# Altium footprint library Hydra_Ref_pcb.PcbLib: 353 footprints (part 2 of 23)
Each footprint in its own frame and in the unit in brackets; x right, y up, seen from the top. Pads: shape width x height; smd on the part's side, far side on the other; paste and mask are expansions set on the pad; w line width, h text height; cw(c..) or ccw(c..) is an arc to the next point about the centre after c.
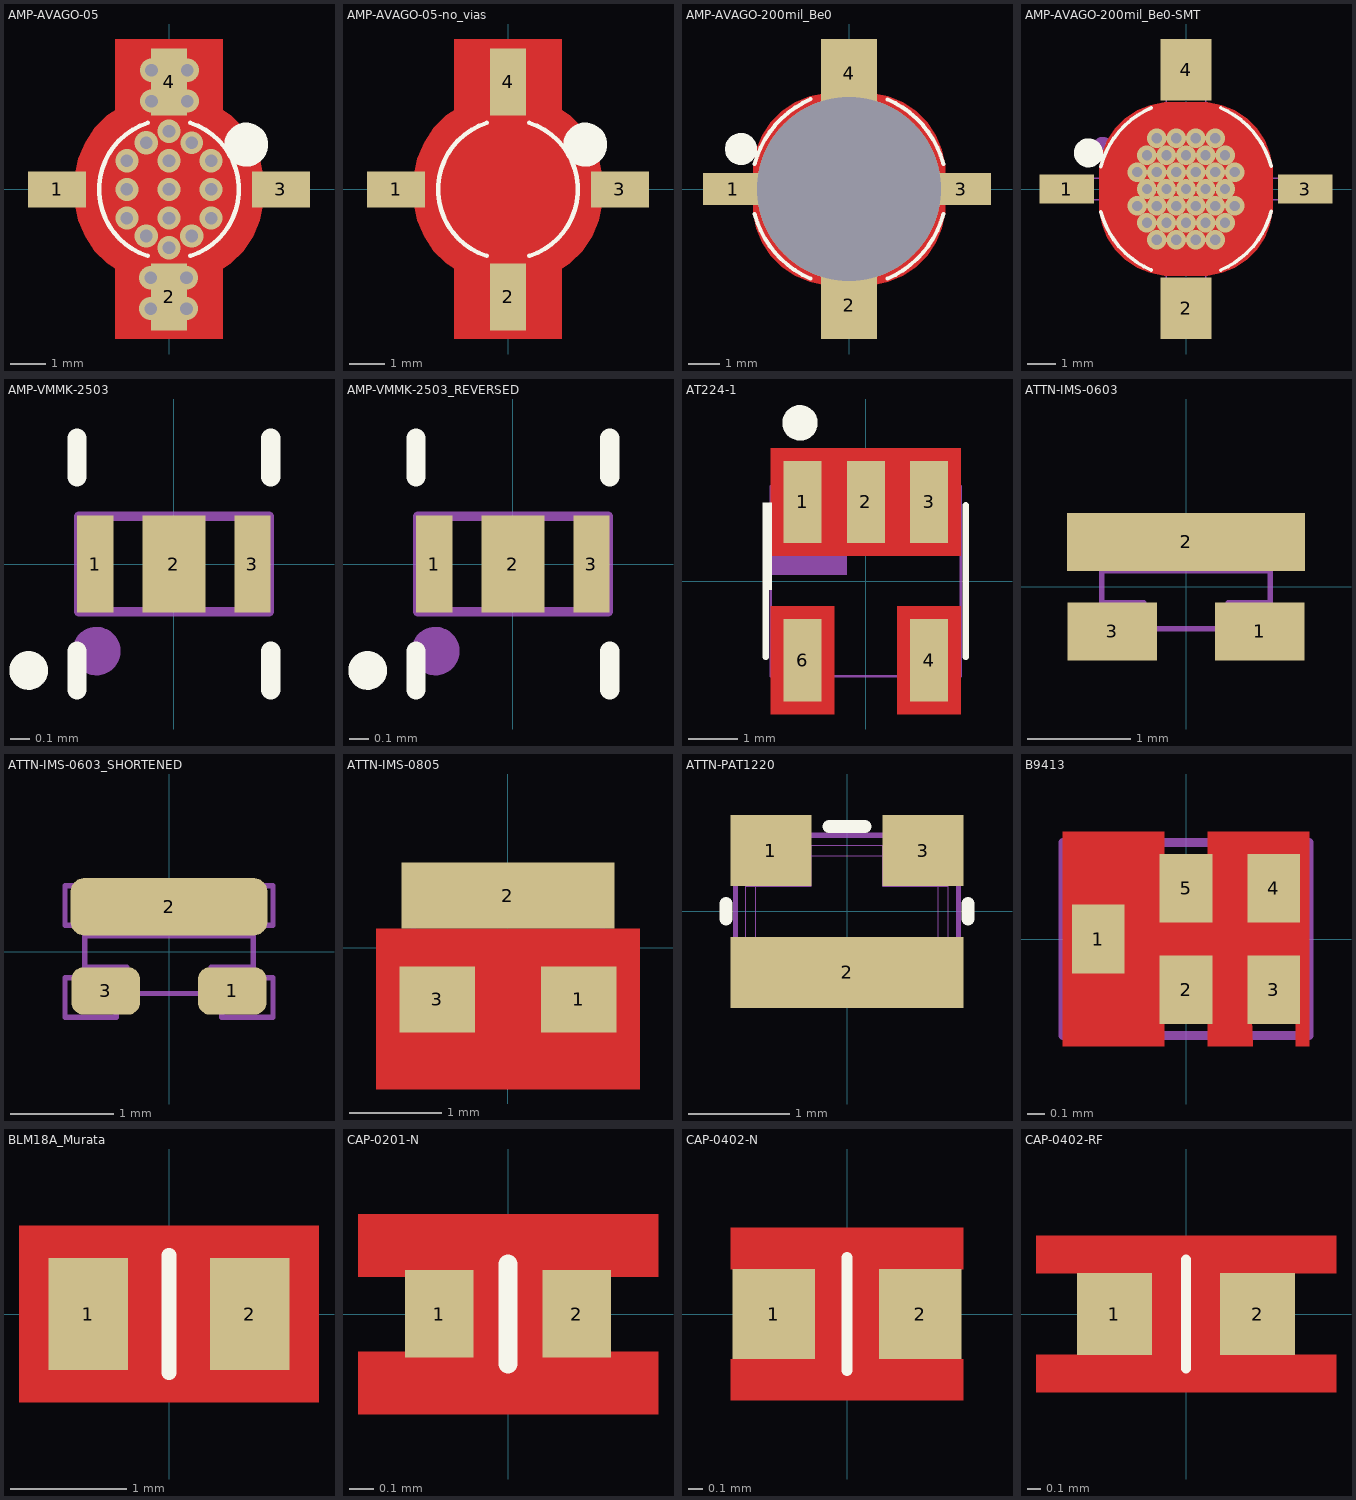
[diagram p1: the footprints below, top view; thin cyan lines are the x and y axes]

## AMP-AVAGO-05 [mil] "05 Plastic Package - Avago"
height 145
pads (4):
  rect 65x40 smd: 1(-125,0) 3(125,0)
  rect 40x75 smd: 2(0,-120) 4(0,120)
via 0,-65 diameter 26 hole 14
via 0,65 diameter 26 hole 14
via -19.56,133 diameter 26 hole 14
via 20.44,133 diameter 26 hole 14
via -20.44,-133 diameter 26 hole 14
via 19.56,-133 diameter 26 hole 14
via 20.44,98.68 diameter 26 hole 14
via -19.56,98.68 diameter 26 hole 14
via 19.56,-98.68 diameter 26 hole 14
via -20.44,-98.68 diameter 26 hole 14
via 0,0 diameter 26 hole 14
via -47,0 diameter 26 hole 14
via -47,32 diameter 26 hole 14
via -47,-32 diameter 26 hole 14
via 47,32 diameter 26 hole 14
via 47,-32 diameter 26 hole 14
via 47,0 diameter 26 hole 14
via 0,-32 diameter 26 hole 14
via 0,32 diameter 26 hole 14
via -25.5,52 diameter 26 hole 14
via 25.5,52 diameter 25 hole 14
via -25.5,-52 diameter 26 hole 14
via 25.5,-52 diameter 26 hole 14
Top Layer:
  rectangle: -20,-157 20,157
  pour cut-out: 5.31,105 15.16,105 34.48,101.16 52.68,93.62 69.06,82.67 82.99,68.75 93.93,52.37 101.47,34.17 105.31,14.85 105.31,5 105.31,-5 105.31,-14.85 101.47,-34.17 93.93,-52.37 82.99,-68.75 69.06,-82.67 52.68,-93.62 34.48,-101.16 15.16,-105 5.31,-105 -5,-105 -14.85,-105 -34.17,-101.16 -52.37,-93.62 -68.75,-82.67 -82.67,-68.75 -93.62,-52.37 -101.16,-34.17 -105,-14.85 -105,-5 -105,5 -105,14.85 -101.16,34.17 -93.62,52.37 -82.67,68.75 -68.75,82.67 -52.37,93.62 -34.17,101.16 -14.85,105 -5,105
  pour cut-out: 60,168 60,-167 -60,-167 -60,168
  region: 0,73 12,72 23,69 37,63 49,54 60,42 60,-42 52,-52 40,-61 26,-68 10,-72 -8,-72 -23.76,-69 -38,-62 -52,-52 -60,-41 -60,42 -51,52 -41,61 -27,68 -15,71 -1,73
Top Overlay:
  circle w25: c86.3,50.09 r12
  lines w5: -23.76,-74.29 cw(c0,0) -23.77,74.29 ; 23.77,-74.29 ccw(c0,0) 23.86,74.26
9 Top Assy:
  circle w2: c0,0 r73
  circle w2: c45,0 r15
  lines w2: -102.5,-15 -102.5,15 ; -71,-15 -135,-15 -125,15 -71,15 ; -15,-102.5 15,-102.5 ; -15,-71 -15,-135 15,-135 15,-71 ; -15,71 -15,135 15,135 15,71 ; -15,102.5 15,102.5 ; 71,-15 135,-15 135,15 71,15 ; 102.5,-15 102.5,15
  text ".Designator" at 15,-60 h35
3D body: height 120, standoff 0, extent -85,-85 85,85

## AMP-AVAGO-05-no_vias [mil] "05 Plastic Package - Avago"
height 145
pads (4):
  rect 65x40 smd: 1(-125,0) 3(125,0)
  rect 40x75 smd: 2(0,-120) 4(0,120)
Top Layer:
  region: 20,70 23,69 37,63 49,54 60,42 60,-42 52,-52 40,-61 26,-68 21,-70 -22,-70 -38,-62 -52,-52 -60,-41 -60,42 -51,52 -41,61 -27,68 -19,70
  pour cut-out: 60,168 60,-167 -60,-167 -60,168
  pour cut-out: 5.31,105 15.16,105 34.48,101.16 52.68,93.62 69.06,82.67 82.99,68.75 93.93,52.37 101.47,34.17 105.31,14.85 105.31,5 105.31,-5 105.31,-14.85 101.47,-34.17 93.93,-52.37 82.99,-68.75 69.06,-82.67 52.68,-93.62 34.48,-101.16 15.16,-105 5.31,-105 -5,-105 -14.85,-105 -34.17,-101.16 -52.37,-93.62 -68.75,-82.67 -82.67,-68.75 -93.62,-52.37 -101.16,-34.17 -105,-14.85 -105,-5 -105,5 -105,14.85 -101.16,34.17 -93.62,52.37 -82.67,68.75 -68.75,82.67 -52.37,93.62 -34.17,101.16 -14.85,105 -5,105
Top Overlay:
  circle w25: c86.3,50.09 r12
  lines w5: -23.76,-74.29 cw(c0,0) -23.77,74.29 ; 23.77,-74.29 ccw(c0,0) 23.86,74.26
9 Top Assy:
  circle w2: c45,0 r15
  circle w2: c0,0 r73
  lines w2: -102.5,-15 -102.5,15 ; -71,-15 -135,-15 -125,15 -71,15 ; -15,-102.5 15,-102.5 ; -15,-71 -15,-135 15,-135 15,-71 ; -15,71 -15,135 15,135 15,71 ; -15,102.5 15,102.5 ; 71,-15 135,-15 135,15 71,15 ; 102.5,-15 102.5,15
  text ".Designator" at 15,-60 h35
3D body: height 120, standoff 0, extent -85,-85 85,85

## AMP-AVAGO-200mil_Be0 [mil] "200mil Be0 Package Dimensions - Avago"
height 58
pads (4):
  rect 75x40 smd: 1(-145,0) 3(140,0)
  rect 70x85 smd: 2(0,-145) 4(0,145)
via 94.5,-23.38 diameter 27 hole 14
via 27,-93.53 diameter 27 hole 14
via 0,-93.53 diameter 27 hole 14
via -27,-93.53 diameter 27 hole 14
via -94.5,-23.38 diameter 27 hole 14
via -94.5,23.38 diameter 27 hole 14
via -27,93.53 diameter 27 hole 14
via 27,93.53 diameter 27 hole 14
via 0,93.53 diameter 27 hole 14
via 40.5,70.15 diameter 27 hole 14
via 54,46.77 diameter 27 hole 14
via 67.5,23.38 diameter 27 hole 14
via 81,0 diameter 27 hole 14
via 13.5,70.15 diameter 27 hole 14
via 40.5,-70.15 diameter 27 hole 14
via 54,-46.77 diameter 27 hole 14
via 67.5,-23.38 diameter 27 hole 14
via 13.5,-70.15 diameter 27 hole 14
via 27,-46.77 diameter 27 hole 14
via -13.5,-70.15 diameter 27 hole 14
via -40.5,-70.15 diameter 27 hole 14
via -54,-46.77 diameter 27 hole 14
via -67.5,-23.38 diameter 27 hole 14
via -81,0 diameter 27 hole 14
via -67.5,23.38 diameter 27 hole 14
via -54,46.77 diameter 27 hole 14
via -40.5,70.15 diameter 27 hole 14
via -13.5,70.15 diameter 27 hole 14
via 27,46.77 diameter 27 hole 14
via 54,0 diameter 27 hole 14
via 40.5,-23.38 diameter 27 hole 14
via 0,-46.77 diameter 27 hole 14
via -27,-46.77 diameter 27 hole 14
via -40.5,-23.38 diameter 27 hole 14
via -54,0 diameter 27 hole 14
via -40.5,23.38 diameter 27 hole 14
via -27,46.77 diameter 27 hole 14
via 0,46.77 diameter 27 hole 14
via 40.5,23.38 diameter 27 hole 14
via 13.5,-23.38 diameter 27 hole 14
via 27,0 diameter 27 hole 14
via 13.5,23.38 diameter 27 hole 14
via -13.5,-23.38 diameter 27 hole 14
via -13.5,23.38 diameter 27 hole 14
via 0,0 diameter 27 hole 14
via -27,0 diameter 27 hole 14
via 0,0 diameter 230 hole 230
via 67.5,70.15 diameter 27 hole 14
via 81,46.77 diameter 27 hole 14
via 67.5,-70.15 diameter 27 hole 14
via 81,-46.77 diameter 27 hole 14
via -81,46.77 diameter 27 hole 14
via -67.5,70.15 diameter 27 hole 14
via -67.5,-70.15 diameter 27 hole 14
via -81,-46.77 diameter 27 hole 14
via 94.5,23.38 diameter 27 hole 14
Top Layer:
  pour cut-out: 20,120 29.85,120 49.17,116.16 67.37,108.62 83.75,97.67 97.67,83.75 108.62,67.37 116.16,49.17 120,29.85 120,20 120,-20 120,-29.85 116.16,-49.17 108.62,-67.37 97.67,-83.75 83.75,-97.67 67.37,-108.62 49.17,-116.16 29.85,-120 20,-120 -20,-120 -29.85,-120 -49.17,-116.16 -67.37,-108.62 -83.75,-97.67 -97.67,-83.75 -108.62,-67.37 -116.16,-49.17 -120,-29.85 -120,-20 -120,20 -120,29.85 -116.16,49.17 -108.62,67.37 -97.67,83.75 -83.75,97.67 -67.37,108.62 -49.17,116.16 -29.85,120 -20,120
Top Overlay:
  circle w20: c-135,50 r10
  lines w5: -117.98,31.05 cw(c0,0) -47.83,112.23 ; -117.94,-31.22 ccw(c0,0) -48.19,-112.08 ; 48.01,112.16 cw(c0,0) 117.94,31.22 ; 48.06,-112.13 ccw(c0,0) 117.98,-31.05
9 Top Assy:
  circle w2: c1,0 r64
  lines w2: -67.05,-77.54 ccw(c-80,-65) -89.55,-49.71 cw(c0,0) -66.99,-77.47 ; -155,-15 -125,15 -80,15 -80,-15 -155,-15 ; -27.5,-155 -27.5,-80 27.5,-80 27.5,-155 -27.5,-155 ; -27.5,80 27.5,80 27.5,155 -27.5,155 -27.5,80 ; 80,-15 80,15 155,15 155,-15 80,-15
  text ".Designator" at -89.55,-20 h50
12 Bott 3D Bodies:
  circle w2: c0,0 r102.5
3D body: height 21, standoff 0, extent -109.98,-109.98 109.98,109.98
3D body: height 58, standoff 0, extent -69.98,-69.98 69.98,69.98

## AMP-AVAGO-200mil_Be0-SMT [mil] "200mil Be0 Package Dimensions - Avago"
height 58
pads (4):
  rect 75x40 smd: 1(-165,0) 3(165,0)
  rect 70x85 smd: 2(0,-165) 4(0,165)
via -27,0 diameter 27 hole 14
via 0,0 diameter 27 hole 14
via -13.5,23.38 diameter 27 hole 14
via -13.5,-23.38 diameter 27 hole 14
via 13.5,23.38 diameter 27 hole 14
via 27,0 diameter 27 hole 14
via 13.5,-23.38 diameter 27 hole 14
via 40.5,23.38 diameter 27 hole 14
via 0,46.77 diameter 27 hole 14
via -27,46.77 diameter 27 hole 14
via -40.5,23.38 diameter 27 hole 14
via -54,0 diameter 27 hole 14
via -40.5,-23.38 diameter 27 hole 14
via -27,-46.77 diameter 27 hole 14
via 0,-46.77 diameter 27 hole 14
via 40.5,-23.38 diameter 27 hole 14
via 54,0 diameter 27 hole 14
via 27,46.77 diameter 27 hole 14
via -13.5,70.15 diameter 27 hole 14
via -40.5,70.15 diameter 27 hole 14
via -54,46.77 diameter 27 hole 14
via -67.5,23.38 diameter 27 hole 14
via -67.5,-23.38 diameter 27 hole 14
via -54,-46.77 diameter 27 hole 14
via -40.5,-70.15 diameter 27 hole 14
via -13.5,-70.15 diameter 27 hole 14
via 27,-46.77 diameter 27 hole 14
via 13.5,-70.15 diameter 27 hole 14
via 67.5,-23.38 diameter 27 hole 14
via 54,-46.77 diameter 27 hole 14
via 40.5,-70.15 diameter 27 hole 14
via 13.5,70.15 diameter 27 hole 14
via 67.5,23.38 diameter 27 hole 14
via 54,46.77 diameter 27 hole 14
via 40.5,70.15 diameter 27 hole 14
Top Layer:
  region: -58.45,84 58.45,84 65,79 70,75 73,72 78,66 82,61 82,-62 77,-68 68,-77 60,-83 -60,-84 -63,-81 -67.05,-77.54 -71,-74 -75,-70 -78,-66 -82,-62 -82,61 -79,66 -75.83,69 -73,72 -69,76 -66,78 -63,81 -60,83
  pour cut-out: 20,120 29.85,120 49.17,116.16 67.37,108.62 83.75,97.67 97.67,83.75 108.62,67.37 116.16,49.17 120,29.85 120,20 120,-20 120,-29.85 116.16,-49.17 108.62,-67.37 97.67,-83.75 83.75,-97.67 67.37,-108.62 49.17,-116.16 29.85,-120 20,-120 -20,-120 -29.85,-120 -49.17,-116.16 -67.37,-108.62 -83.75,-97.67 -97.67,-83.75 -108.62,-67.37 -116.16,-49.17 -120,-29.85 -120,-20 -120,20 -120,29.85 -116.16,49.17 -108.62,67.37 -97.67,83.75 -83.75,97.67 -67.37,108.62 -49.17,116.16 -29.85,120 -20,120
Top Overlay:
  circle w20: c-135,50 r10
  lines w5: -117.98,31.05 cw(c0,0) -47.83,112.23 ; -117.94,-31.22 ccw(c0,0) -48.19,-112.08 ; 48.01,112.16 cw(c0,0) 117.94,31.22 ; 48.06,-112.13 ccw(c0,0) 117.98,-31.05
Top Paste:
  region: -58.45,84 58.45,84 65,79 70,75 73,72 78,66 82,61 82,-62 77,-68 68,-77 60,-83 -60,-84 -63,-81 -67.05,-77.54 -71,-74 -75,-70 -78,-66 -82,-62 -82,61 -79,66 -75.83,69 -73,72 -69,76 -66,78 -63,81 -60,83
Top Solder:
  region: -58.45,84 58.45,84 65,79 70,75 73,72 78,66 82,61 82,-62 77,-68 68,-77 60,-83 -60,-84 -63,-81 -67.05,-77.54 -71,-74 -75,-70 -78,-66 -82,-62 -82,61 -79,66 -75.83,69 -73,72 -69,76 -66,78 -63,81 -60,83
9 Top Assy:
  circle w14: c-115.19,58 r7
  circle w2: c1,0 r64
  circle w2: c0,0 r102.5
  lines w2: -129,-15 -129,15 ; -27.51,-124.01 27.49,-124.01 ; -27.5,124 27.5,124 ; 129,-15 129,15 ; -199,-15 -80,-15 -80,15 -169,15 -199,-15 ; -27.51,-202.01 27.49,-202.01 27.49,-80.01 -27.51,-80.01 -27.51,-202.01 ; -27.5,80 -27.5,202 27.5,202 27.5,80 -27.5,80 ; 80,-15 198,-15 198,15 80,15 80,-15
  text ".Designator" at -89.55,-20 h50
12 Bott 3D Bodies:
  circle w2: c0,0 r102.5
3D body: height 21, standoff 0, extent -109.98,-109.98 109.98,109.98
3D body: height 58, standoff 0, extent -69.98,-69.98 69.98,69.98

## AMP-VMMK-2503 [mil] "0.5x1.05x0.25mm"
height 11.81
pads (3):
  rect 7.5x20 smd mask+3: 1(-16.25,0) 3(16.25,0)
  rect 13x20 smd mask+3: 2(0,0)
Top Overlay:
  circle w4: c-30,-22 r2
  lines w4: -20,-26 -20,-18 ; -20,18 -20,26 ; 20,-26 20,-18 ; 20,18 20,26
Top Solder:
  pour cut-out: 24,17 30,17 30,-17 24,-17
  pour cut-out: -24,17 -30,17 -30,-17 -24,-17
  pour cut-out: -17,20 -17,14 17,14 17,20
  pour cut-out: -17,-20 -17,-14 17,-14 17,-20
9 Top Assy:
  circle w5: c-16,-18 r2.5
  lines w2: -19.68,-9.84 -19.68,9.84 19.68,9.84 19.68,-9.84 -19.68,-9.84
  text ".Designator" at 18.12,4.46 h10
3D body: height 11.81, standoff 0.39, extent -19.68,-10 19.68,10

## AMP-VMMK-2503_REVERSED [mil] "0.5x1.05x0.25mm"
height 11.81
pads (3):
  rect 7.5x20 smd mask+3: 1(-16.25,0) 3(16.25,0)
  rect 13x20 smd mask+3: 2(0,0)
Top Overlay:
  circle w4: c-30,-22 r2
  lines w4: -20,-26 -20,-18 ; -20,18 -20,26 ; 20,-26 20,-18 ; 20,18 20,26
Top Solder:
  pour cut-out: -17,-20 -17,-14 17,-14 17,-20
  pour cut-out: -17,20 -17,14 17,14 17,20
  pour cut-out: -24,17 -30,17 -30,-17 -24,-17
  pour cut-out: 24,17 30,17 30,-17 24,-17
9 Top Assy:
  circle w5: c-16,-18 r2.5
  lines w2: -19.68,-9.84 19.68,-9.84 19.68,9.84 -19.68,9.84 -19.68,-9.84
  text ".Designator" at 18.12,4.46 h10
3D body: height 11.81, standoff 0.39, extent -19.68,-10 19.68,10

## AT224-1 [mil] "MINI-CIRCUITS XFORMER"
height 160
pads (5):
  rect 30x65 smd: 1(-50,62.5) 2(0,62.5) 3(50,62.5) 4(50,-62.5) 6(-50,-62.5)
Top Layer:
  pour cut-out: -75,105 -75,20 75,20 75,105
  pour cut-out: -75,-20 -75,-105 -25,-105 -25,-20
  pour cut-out: 25,-20 25,-105 75,-105 75,-20
Top Overlay:
  circle w14: c-52,125 r7
  region: -74,-7 -74,62 -81.5,62 -81.5,-7
  lines w5: -79,-60 -79,58 ; 79,-60 79,60
9 Top Assy:
  region: -15,75 -75,75 -75,5 -15,5
  lines w2: -64,-60 -64,-80 -36,-80 -36,-60 ; -64,60 -64,80 -36,80 -36,60 ; -14,60 -14,80 14,80 14,60 ; 36,-60 36,-80 64,-80 64,-60 ; 36,60 36,80 64,80 64,60 ; -75,-75 -75,75 75,75 75,-75 -75,-75
  text ".Designator" at -55,-15 h25
3D body: height 160, standoff 0.39, extent -75,-75 75,75

## ATTN-IMS-0603 [mil] "ATTENUATOR, 0805, IMS"
height 20
pads (3):
  rect 34x22 smd mask+2: 1(28,-17) 3(-28,-17)
  rect 90.55x22 smd: 2(0,17)
Top Solder:
  pour cut-out: -57,47 57,47 57,-45 28,-45 28,-6 -29,-6 -29,-45 -57,-45
9 Top Assy:
  lines w2: -32,-6 -16,-6 -16,-16 ; -32,6 32,6 ; 16,-16 16,-6 32,-6 ; -32,-16 -32,16 32,16 32,-16 -32,-16
  text ".Designator" at -26,-8 h15
13 Top 3D Bodies:
  lines w2: -39.5,-25 -20,-25 -20,-10 -39.5,-10 -39.5,-25 ; -39.5,10 -39.5,25 39.5,25 39.5,10 -39.5,10 ; 20,-25 20,-10 39.5,-10 39.5,-25 20,-25
3D body: height 16.5, standoff 3.5, extent -39.98,-20.98 39.98,20.98
3D body: height 20, standoff 0, extent -39.48,-24.98 -20.02,-10.02
3D body: height 20, standoff 0, extent -39.48,10.02 39.48,24.98
3D body: height 20, standoff 0, extent 20.02,-24.98 39.48,-10.02
3D body: height 17.5, standoff 16.5, extent -29,-18 29,11

## ATTN-IMS-0603_SHORTENED [mil] "ATTENUATOR, 0805, IMS"
height 20
pads (3):
  rrect50% 26x18 smd mask+2: 1(24,-15) 3(-24,-15)
  rrect50% 75x22 smd: 2(0,17)
Top Solder:
  pour cut-out: -57,47 57,47 57,-45 28,-45 28,-6 -29,-6 -29,-45 -57,-45
9 Top Assy:
  lines w2: -32,-6 -16,-6 -16,-16 ; -32,6 32,6 ; 16,-16 16,-6 32,-6 ; -32,-16 -32,16 32,16 32,-16 -32,-16
  text ".Designator" at -26,-8 h15
13 Top 3D Bodies:
  lines w2: -39.5,-25 -20,-25 -20,-10 -39.5,-10 -39.5,-25 ; -39.5,10 -39.5,25 39.5,25 39.5,10 -39.5,10 ; 20,-25 20,-10 39.5,-10 39.5,-25 20,-25
3D body: height 16.5, standoff 3.5, extent -39.98,-20.98 39.98,20.98
3D body: height 20, standoff 0, extent -39.48,-24.98 -20.02,-10.02
3D body: height 20, standoff 0, extent -39.48,10.02 39.48,24.98
3D body: height 20, standoff 0, extent 20.02,-24.98 39.48,-10.02
3D body: height 17.5, standoff 16.5, extent -29,-18 29,11

## ATTN-IMS-0805 [mil] "ATTENUATOR, 0805, IMS"
height 20
pads (3):
  rect 32x28 smd mask+2: 1(29.98,-22) 3(-30,-22)
  rect 90.55x28 smd: 2(0,22)
Top Layer:
  pour cut-out: 56,8 -56,8 -56,-60 56,-60
Top Solder:
  pour cut-out: -57,47 57,47 57,-45 28,-45 28,-6 -29,-6 -29,-45 -57,-45
9 Top Assy:
  lines w2: -40,-10 -20,-10 -20,-25 ; -40,10 40,10 ; 20,-25 20,-10 40,-10 ; -40,-25 40,-25 40,25 -40,25 -40,-25
  text ".Designator" at -26,-8 h15
13 Top 3D Bodies:
  lines w2: -39.5,-25 -39.5,-10 -20,-10 -20,-25 -39.5,-25 ; -39.5,10 39.5,10 39.5,25 -39.5,25 -39.5,10 ; 20,-25 39.5,-25 39.5,-10 20,-10 20,-25
3D body: height 17.5, standoff 16.5, extent -29,-18 29,11
3D body: height 20, standoff 0, extent 20.02,-24.98 39.48,-10.02
3D body: height 20, standoff 0, extent -39.48,10.02 39.48,24.98
3D body: height 20, standoff 0, extent -39.48,-24.98 -20.02,-10.02
3D body: height 16.5, standoff 3.5, extent -39.98,-20.98 39.98,20.98

## ATTN-PAT1220 [mm] "ATTENUATOR, PAT 1220"
height 0.5
pads (3):
  rect 0.8x0.7 smd: 1(-0.75,0.6) 3(0.75,0.6)
  rect 2.3x0.7 smd: 2(0,-0.6)
Top Overlay:
  lines w0.127: -1.194,-0.076 -1.194,0.076 ; -0.178,0.838 0.178,0.838 ; 1.194,-0.076 1.194,0.076
Top Solder:
  pour cut-out: -1.404,-1.206 1.404,-1.206 1.404,1.206 -1.404,1.206
9 Top Assy:
  lines w0.051: -1.1,-0.75 -1.1,0.75 1.1,0.75 1.1,-0.75 -1.1,-0.75
  text ".Designator" at 0.763,0.275 h0.55
16 Title Block:
  lines w0.01: -0.85,0.65 -0.16,0.65 ; -0.35,-0.65 -1,-0.65 ; 0.35,-0.65 1,-0.65 ; -1,-0.65 -1,0.65 ; -1,-0.65 1,-0.65 ; -1,-0.65 -1,-0.35 1,-0.35 1,-0.65 ; -1,0.65 1,0.65 ; -1,0.65 -0.35,0.65 -0.35,0.25 -1,0.25 -1,0.65 ; 1,-0.65 1,0.65 ; 1,0.65 0.35,0.65 0.35,0.25 1,0.25 1,0.65 ; -1.1,-0.75 -1.1,0.75 1.1,0.75 1.1,-0.75 -1.1,-0.75 ; -0.9,-0.55 -0.9,0.55 0.9,0.55 0.9,-0.55 -0.9,-0.55
3D body: height 0.5, standoff 0, extent -1.118,-0.762 1.118,0.762

## B9413 [mm] "Epcos SAW Filter"
height 0.4
pads (5):
  rect 0.3x0.39 smd mask+0.064: 1(-0.5,0) 2(0,-0.288) 3(0.5,-0.288) 4(0.5,0.288) 5(0,0.288)
Top Layer:
  pour cut-out: 0.7,0.61 0.7,-0.61 0.625,-0.61 0.625,-0.45 0.375,-0.45 0.381,-0.61 0.125,-0.61 0.125,-0.45 -0.125,-0.45 -0.125,-0.61 -0.7,-0.61 -0.7,0.61 -0.125,0.61 -0.125,0.45 0.125,0.45 0.125,0.61
Top Solder:
  pour cut-out: -0.853,0.686 0.853,0.686 0.853,-0.686 -0.853,-0.686
9 Top Assy:
  lines w0.013: -0.625,-0.163 -0.625,0.163 -0.375,0.163 -0.375,-0.163 -0.625,-0.163 ; -0.125,-0.45 0.125,-0.45 0.125,-0.125 -0.125,-0.125 -0.125,-0.45 ; -0.125,0.125 0.125,0.125 0.125,0.45 -0.125,0.45 -0.125,0.125 ; 0.375,-0.45 0.625,-0.45 0.625,-0.125 0.375,-0.125 0.375,-0.45 ; 0.375,0.125 0.625,0.125 0.625,0.45 0.375,0.45 0.375,0.125
  lines w0.051: -0.7,-0.55 -0.7,0.55 0.7,0.55 0.7,-0.55 -0.7,-0.55
  text ".Designator" at -0.45,-0.1 h0.25
3D body: height 0.61, standoff 0, extent -0.546,-0.356 0.546,0.356

## BLM18A_Murata [mil] "EMI FILTER, 0603"
height 35
pads (2):
  rect 27x38 smd: 1(-27.5,0) 2(27.5,0)
Top Layer:
  pour cut-out: -51,-30 51,-30 51,30 -51,30
Top Overlay:
  lines w5: 0,-20 0,20
9 Top Assy:
  lines w2: -32,-16 -32,16 32,16 32,-16 -32,-16
  text ".Designator" at -26,-8 h15
3D body: height 35, standoff 0, extent -32,-16 32,16

## CAP-0201-N [mil] "Metric 1005"
height 12
pads (2):
  rect 11x14 smd mask+2: 1(-11,0) 2(11,0)
Top Layer:
  pour cut-out: -24,16 24,16 24,6 14,6 14,-6 24,-6 24,-16 -24,-16 -24,-6 -14,-6 -14,6 -24,6
Top Overlay:
  lines w3: 0,-8 0,8
Top Solder:
  rectangle: -9.45,-9 9.45,9
9 Top Assy:
  lines w1.5: -13,-7 13,-7 13,7 -13,7 -13,-7
  text ".Designator" at -12,-3 h6
3D body: height 24, standoff 0.39, extent -12,-6 12,6

## CAP-0402-N [mil] "Metric 1005"
height 24
pads (2):
  rect 22x24 smd mask+2: 1(-19.5,0) 2(19.5,0)
Top Layer:
  pour cut-out: -31,23 31,23 31,12 24,12 24,-12 31,-12 31,-23 -31,-23 -31,-12 -24,-12 -24,12 -31,12
Top Overlay:
  lines w3: 0,-15 0,15
Top Solder:
  rectangle: -32,-14 32,14
  pour cut-out: -40,21 40,21 40,-21 -40,-21
9 Top Assy:
  lines w2: -22,-12 -22,12 22,12 22,-12 -22,-12
  text ".Designator" at -15,-5 h10
3D body: height 24, standoff 0.39, extent -22,-12 22,12

## CAP-0402-RF [mil]
height 24
pads (2):
  rect 22x24 smd mask+2: 1(-21,0) 2(21,0)
Top Layer:
  pour cut-out: -44,23 44,23 44,12 21,12 21,-12 44,-12 44,-23 -44,-23 -44,-12 -22,-12 -22,12 -44,12
Top Overlay:
  lines w3: 0,-16 0,16
Top Solder:
  rectangle: -32,-14 32,14
  pour cut-out: -41,21 41,21 41,-21 -41,-21
9 Top Assy:
  lines w2: -22,-12 -22,12 22,12 22,-12 -22,-12
  text ".Designator" at -16,-6 h12
3D body: height 24, standoff 0.39, extent -22,-12 22,12